# Altium footprint library 开关_按键封装库.PcbLib: 175 footprints (part 3 of 11)
Each footprint in its own frame and in the unit in brackets; x right, y up, seen from the top. Pads: shape width x height; smd on the part's side, far side on the other; paste and mask are expansions set on the pad; w line width, h text height; cw(c..) or ccw(c..) is an arc to the next point about the centre after c.
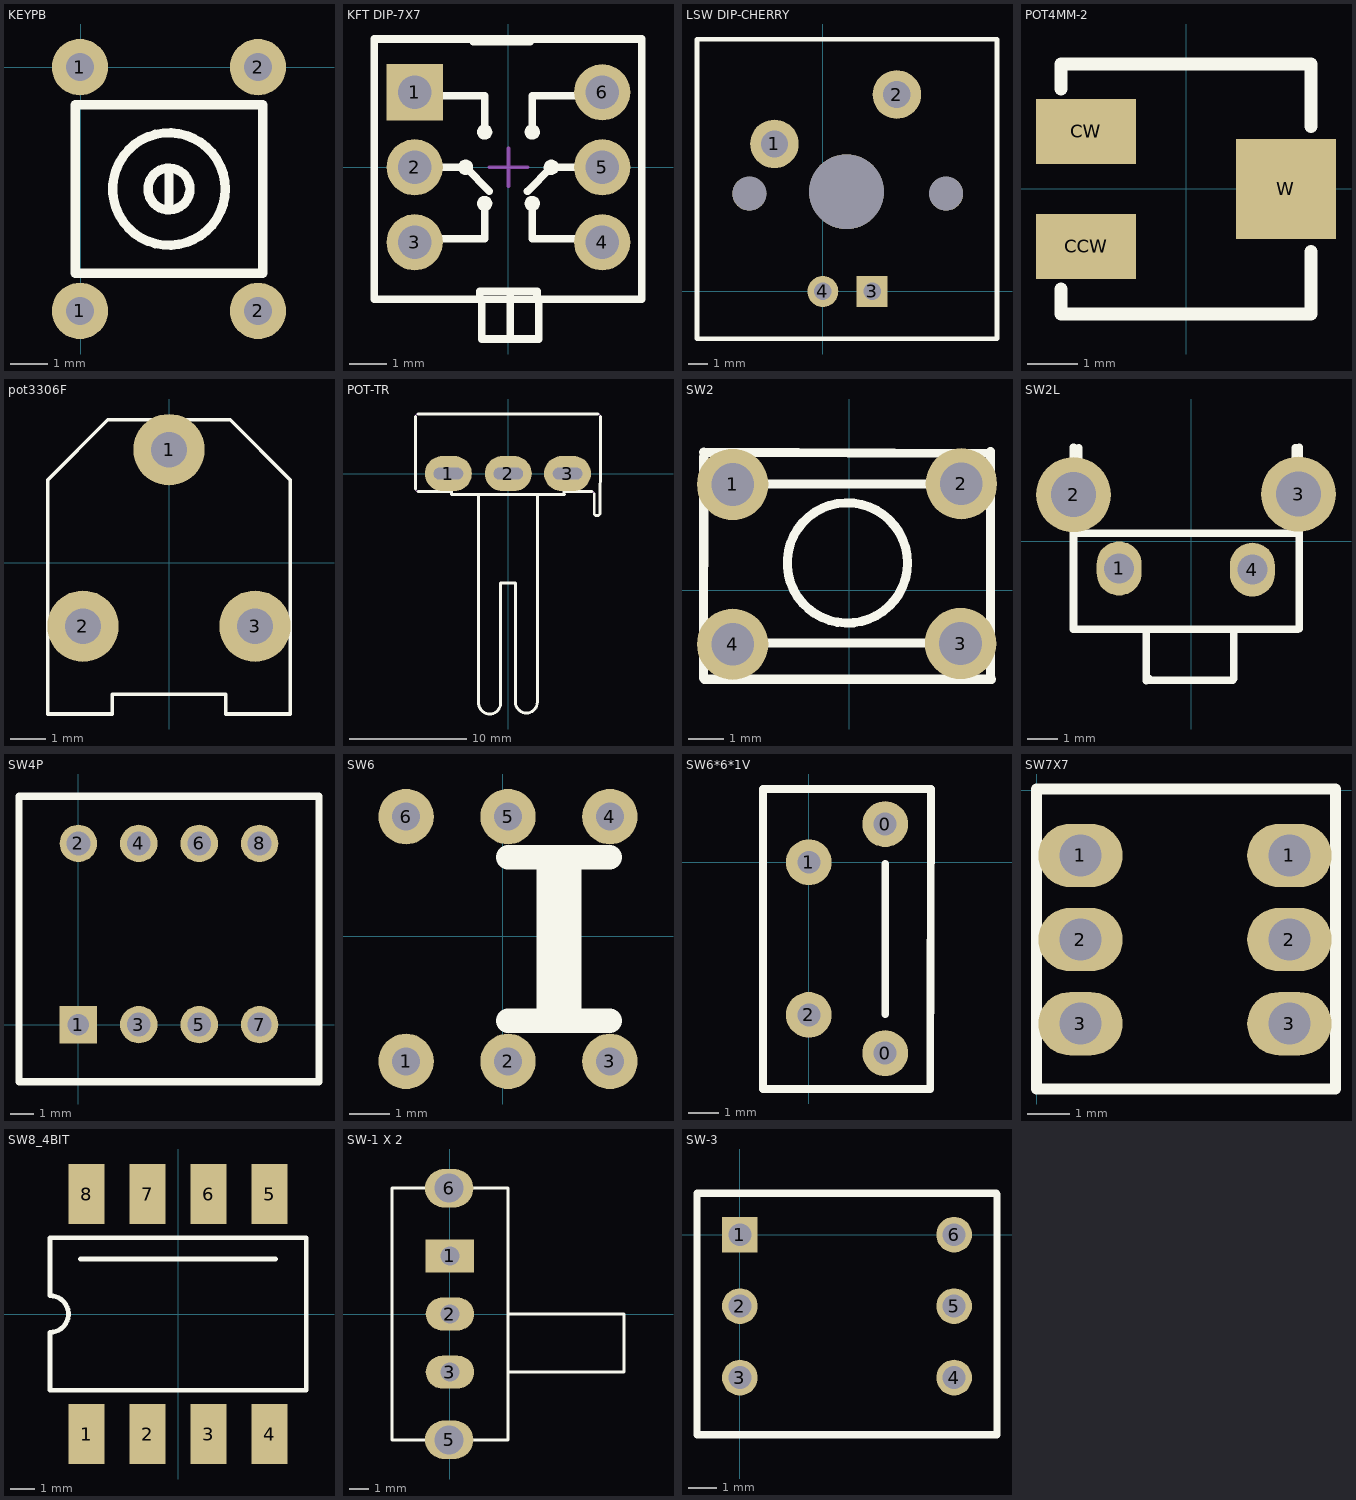
[diagram p2: the footprints below, top view; thin cyan lines are the x and y axes]

## KEYPB [mil]
pads (4):
  round 60 hole 30: 1(-1,-260) 1(-1,0) 2(189,-260) 2(189,0)
Top Overlay:
  circle w10: c94,-130 r60
  circle w10: c94,-130 r22.36
  lines w10: 94,-150 94,-110 ; -6,-220 -6,-40 194,-40 194,-220 -6,-220

## KFT DIP-7X7 [mm] "自锁开关，规格：7*7mm"
pads (6):
  rect 1.5x1.5 hole 0.9: 1(-2.5,2)
  round 1.5 hole 0.9: 2(-2.5,0) 3(-2.5,-2) 4(2.5,-2) 5(2.5,0) 6(2.5,2)
Top Overlay:
  circle w0.254: c0.635,0.94 r0.076
  circle w0.254: c-0.635,0.94 r0.076
  circle w0.254: c0.635,-0.965 r0.076
  circle w0.254: c-0.635,-0.965 r0.076
  circle w0.254: c1.143,0 r0.076
  circle w0.254: c-1.143,0 r0.076
  lines w0.203: -2.54,-1.905 -1.524,-1.905 -0.635,-1.905 -0.635,-0.889 ; -2.54,0 -1.143,0 -0.508,-0.635 ; -2.54,1.905 -0.635,1.905 -0.635,1.016 ; -0.94,3.344 0.584,3.344 ; -0.762,-3.514 -0.762,-3.309 0.762,-3.309 0.762,-3.514 ; -0.712,-3.563 -0.712,-4.579 0.812,-4.579 0.812,-3.563 ; 0.05,-4.579 0.05,-3.436 ; 0.508,-0.635 1.143,0 2.54,0 ; 0.635,-0.889 0.635,-1.905 2.54,-1.905 ; 0.635,1.016 0.635,1.905 2.54,1.905 ; -3.581,-3.514 -3.581,3.42 3.556,3.42 3.556,-3.514 2.54,-3.514 -3.581,-3.514
Mechanical 15:
  lines w0.1: -0.508,0 0.508,0 ; 0,-0.508 0,0.508
3D body "SLSW 7x7.STEP": height 11.2, standoff -3.2, extent -3.5,-3.5 3.5,3.5

## LSW DIP-CHERRY [mm]
pads (7):
  round 2.5 hole 1.4: 1(-2.489,7.595) 2(3.81,10.135)
  rect 1.6x1.6 hole 0.9: 3(2.54,0)
  round 1.6 hole 0.9: 4(0,0)
  round 1.75 hole 1.75: ""(-3.785,5.029) ""(6.35,5.029)
  round 3.85 hole 3.85: ""(1.219,5.131)
Top Overlay:
  lines w0.254: -6.477,-2.438 -6.477,12.979 8.966,12.979 8.966,-2.438 -6.477,-2.438
3D body "凯?": height 3.45, standoff -15.75, extent -6.581,-2.669 9.019,12.931

## PCBComponent_1 [mm]

## POT4MM-2 [mm] "Square Trimming Potentiometer"
pads (3):
  rect 2x1.3 smd: CCW(-2,-1.15) CW(-2,1.15)
  rect 2x2 smd: W(2,0)
Top Overlay:
  lines w0.254: -2.5,-2 -2.5,-2.5 2.5,-2.5 2.5,-1.25 ; -2.5,2 -2.5,2.5 2.5,2.5 2.5,1.25
3D body "POT4MM-2.STEP": height 5.5, standoff 0, extent -2.489,-2.438 2.511,2.562

## pot3306F [mm]
pads (3):
  round 2 hole 1: 1(0,3.175) 2(-2.413,-1.778) 3(2.413,-1.778)
Top Overlay:
  lines w0.1: -2.611,-4.241 -1.595,-4.241 ; -2.964,-1.533 -2.964,-2.07 -3.405,-2.07 -3.405,-1.533 -2.964,-1.533 ; -2.964,-1.533 -2.084,-1.533 -2.084,-2.076 ; -2.964,-1.533 -2.964,-2.076 -2.084,-2.076 ; -2.084,-2.076 -2.084,-1.535 -1.595,-1.535 -1.595,-2.076 -2.084,-2.076 ; -1.595,-4.241 -3.405,-4.241 -3.405,-3.681 -3.405,-3.049 -3.405,2.323 -1.719,4.01 1.719,4.01 3.405,2.323 3.405,-3.681 3.405,-4.241 1.595,-4.241 1.595,-3.681 -1.595,-3.681 -1.595,-4.241 ; -0.464,3.474 -0.464,2.938 -0.905,2.938 -0.905,3.474 -0.464,3.474 ; -0.464,3.474 0.416,3.474 0.416,2.94 ; -0.464,3.474 -0.464,2.94 0.416,2.94 ; 0.416,2.94 0.416,3.479 0.905,3.479 0.905,2.94 0.416,2.94 ; 2.036,-1.533 2.036,-2.07 1.595,-2.07 1.595,-1.533 2.036,-1.533 ; 2.036,-1.533 2.916,-1.533 2.916,-2.076 ; 2.036,-1.533 2.036,-2.076 2.916,-2.076 ; 2.916,-2.076 2.916,-1.535 3.405,-1.535 3.405,-2.076 2.916,-2.076
3D body "User Library-Trimmer, 3306F-1.STEP": height 7.62, standoff -3.04, extent -3.302,-4.191 3.508,4.061

## POT-TR [mm]
pads (3):
  oval 4x3 hole 1 slot 2.5 at 0 deg: 1(-5.104,0) 2(0,0) 3(5.05,0)
Top Overlay:
  lines w0.254: -7.899,-1.324 -7.899,0 -7.899,4.88 ; -7.699,-1.524 -7.524,-1.524 -6.342,-1.524 -4.979,-1.524 -4.829,-1.524 -4.829,-1.778 4.778,-1.778 ; -7.699,5.08 -6.883,5.08 6.757,5.08 7.649,5.08 ; -0.724,-0.25 0.673,-0.25 0.673,0.25 -0.724,0.25 -0.724,-0.228 ; 4.74,-1.778 4.74,-1.524 7.122,-1.524 ; 7.322,-3.429 7.322,-1.724 ; 7.449,-3.556 7.702,-3.556 ; 7.829,-3.429 7.829,-1.524 7.849,0 7.849,3.048 7.849,4.88 ; -5.804,-0.25 -4.407,-0.25 -4.407,0.25 -5.804,0.25 -5.804,-0.25 ; -2.521,-19.462 ccw(c-1.59,-19.544) -0.66,-19.462 -0.66,-9.302 0.61,-9.302 0.61,-19.462 ccw(c1.543,-19.462) 2.477,-19.462 2.477,-9.302 2.477,-1.778 -2.521,-1.778 -2.521,-9.302 -2.521,-19.462 ; 4.356,-0.25 5.753,-0.25 5.753,0.25 4.356,0.25 4.356,-0.25
Mechanical 6:
  lines w0.1: -7.899,-1.324 ccw(c-7.699,-1.324) -7.699,-1.524 ; -7.899,4.88 cw(c-7.699,4.88) -7.699,5.08 ; 7.122,-1.524 cw(c7.122,-1.724) 7.322,-1.724 ; 7.649,5.08 cw(c7.649,4.88) 7.849,4.88
3D body "User Library-Pot.STEP": height 20.62, standoff -4, extent -7.849,-20.433 7.899,5.135

## SW2 [mm]
pads (4):
  round 2 hole 1.2: 1(-3.27,2.96) 2(3.14,2.98) 3(3.12,-1.5) 4(-3.27,-1.52)
Top Overlay:
  circle w0.254: c-0.056,0.76 r1.686
  lines w0.254: -4.09,-2.46 -4.08,3.735 ; -4.08,3.862 3.96,3.83 ; -4.062,-2.5 3.98,-2.5 ; -3.191,2.973 3.413,2.973 ; -3.107,-1.48 3.37,-1.48 ; 3.958,-2.502 3.96,3.88

## SW2L [mm]
pads (4):
  oval 1.5x1.8 hole 1: 1(-2.4,-0.9) 4(2.04,-0.94)
  round 2.5 hole 1.5: 2(-3.92,1.56) 3(3.58,1.58)
Top Overlay:
  lines w0.254: -3.92,3.14 -3.92,-2.92 3.56,-2.92 ; -3.88,0.28 3.6,0.28 ; -3.74,3.12 -3.74,0.42 -3.72,0.4 ; -1.5,-2.92 -1.5,-4.64 -1.42,-4.56 ; -1.46,-4.62 1.38,-4.62 1.42,-4.58 1.42,-3.02 ; 3.48,0.46 3.48,3.12 ; 3.6,-2.9 3.6,3.14

## SW4P [mil]
pads (8):
  rect 62x62 hole 35.43: 1(0,0)
  round 62 hole 39.37: 2(0,300) 3(100,0) 4(100,300) 5(200,0) 6(200,300) 7(300,0) 8(300,300)
Top Overlay:
  lines w12: -98.43,-94.49 398.43,-94.49 398.43,377.95 -98.43,377.95 -98.43,-94.49
3D body "SWDIP4.stp": height 409.45, standoff -118.11, extent -81.7,-133.46 379.72,362.6

## SW6 [mm]
pads (6):
  round 1.38 hole 0.7: 1(-2.409,-3.119) 2(0.131,-3.119) 3(2.671,-3.119) 4(2.671,2.977) 5(0.131,2.977) 6(-2.409,2.977)
Top Overlay:
  lines w0.61: 0.131,-2.103 2.671,-2.103 ; 0.131,1.961 2.671,1.961 ; 1.147,-2.103 1.147,1.707 ; 1.655,-2.103 1.655,1.961

## SW6*6*1V [mil]
pads (4):
  round 60 hole 30: 0(100,-250) 0(100,50) 1(0,0) 2(0,-200)
Top Overlay:
  lines w10: 100,-199 100,-2 ; 157,96 160,96 ; 160,96 -60,96 -60,-297 159,-297 160,96

## SW7X7 [mm]
pads (6):
  oval 2x1.5 hole 1: 1(1.041,-1.549) 1(5.994,-1.549) 2(1.041,-3.543) 2(5.994,-3.543) 3(1.041,-5.537) 3(5.994,-5.537)
Top Overlay:
  lines w0.254: 0,-7.087 0,0.025 7.087,0.025 7.087,-7.087 0,-7.087
3D body "button with fixation.step": height 13, standoff -4, extent -0.02,-7.087 6.98,-0.087

## SW8_4BIT [mm] "贴片拨码开关"
height 1.75
pads (8):
  rect 1.5x2.5 smd: 1(-3.81,-5) 2(-1.27,-5) 3(1.27,-5) 4(3.81,-5) 5(3.81,5) 6(1.27,5) 7(-1.27,5) 8(-3.81,5)
Top Overlay:
  lines w0.2: -4.064,2.286 4.064,2.286 ; -5.334,-3.175 5.334,-3.175 5.334,3.175 -5.334,3.175 -5.334,0.762 cw(c-5.334,0) -5.334,-0.762 -5.334,-3.175
3D body: height 2.15, standoff 2.05, extent 3.048,0.889 4.572,2.413
3D body: height 2.15, standoff 2.05, extent 0.508,0.889 2.032,2.413
3D body: height 2.15, standoff 2.05, extent -2.032,-2.032 -0.508,-0.508
3D body: height 2.15, standoff 2.05, extent -4.572,0.889 -3.048,2.413
3D body: height 2.05, standoff 2, extent 3.048,-2.032 4.572,2.413
3D body: height 2.05, standoff 2, extent 0.508,-2.032 2.032,2.413
3D body: height 2.05, standoff 2, extent -2.032,-2.032 -0.508,2.413
3D body: height 2.05, standoff 2, extent -4.572,-2.032 -3.048,2.413
3D body: height 2, standoff 0, extent -5.207,-3.429 5.08,3.429

## SW-1 X 2 [mm]
pads (5):
  rect 2.5x1.7 hole 1: 1(0,3)
  oval 2.5x1.7 hole 1: 2(0,0) 3(0,-3)
  oval 2.5x2 hole 1.5: 5(-0.04,-6.5) 6(-0.04,6.5)
Top Overlay:
  lines w0.15: 3,-3 9,-3 9,0 3,0 ; -3,-6.5 -3,6.5 3,6.5 3,-6.5 -3,-6.5
3D body "User Library-SLIDE SWITCH SS12F23.STEP": height 5.25, standoff -3.85, extent -3.452,-6.5 9.447,6.5

## SW-3 [mil]
pads (6):
  rect 50x50 hole 32: 1(0,0)
  round 50 hole 32: 2(0,-100) 3(0,-200) 4(300,-200) 5(300,-100) 6(300,0)
Top Overlay:
  lines w10: -60,-280 -60,58 359,58 360,57 360,-280 -60,-280